# Altium footprint library neoxin.PcbLib: 61 footprints (part 3 of 4)
Each footprint in its own frame and in the unit in brackets; x right, y up, seen from the top. Pads: shape width x height; smd on the part's side, far side on the other; paste and mask are expansions set on the pad; w line width, h text height; cw(c..) or ccw(c..) is an arc to the next point about the centre after c.
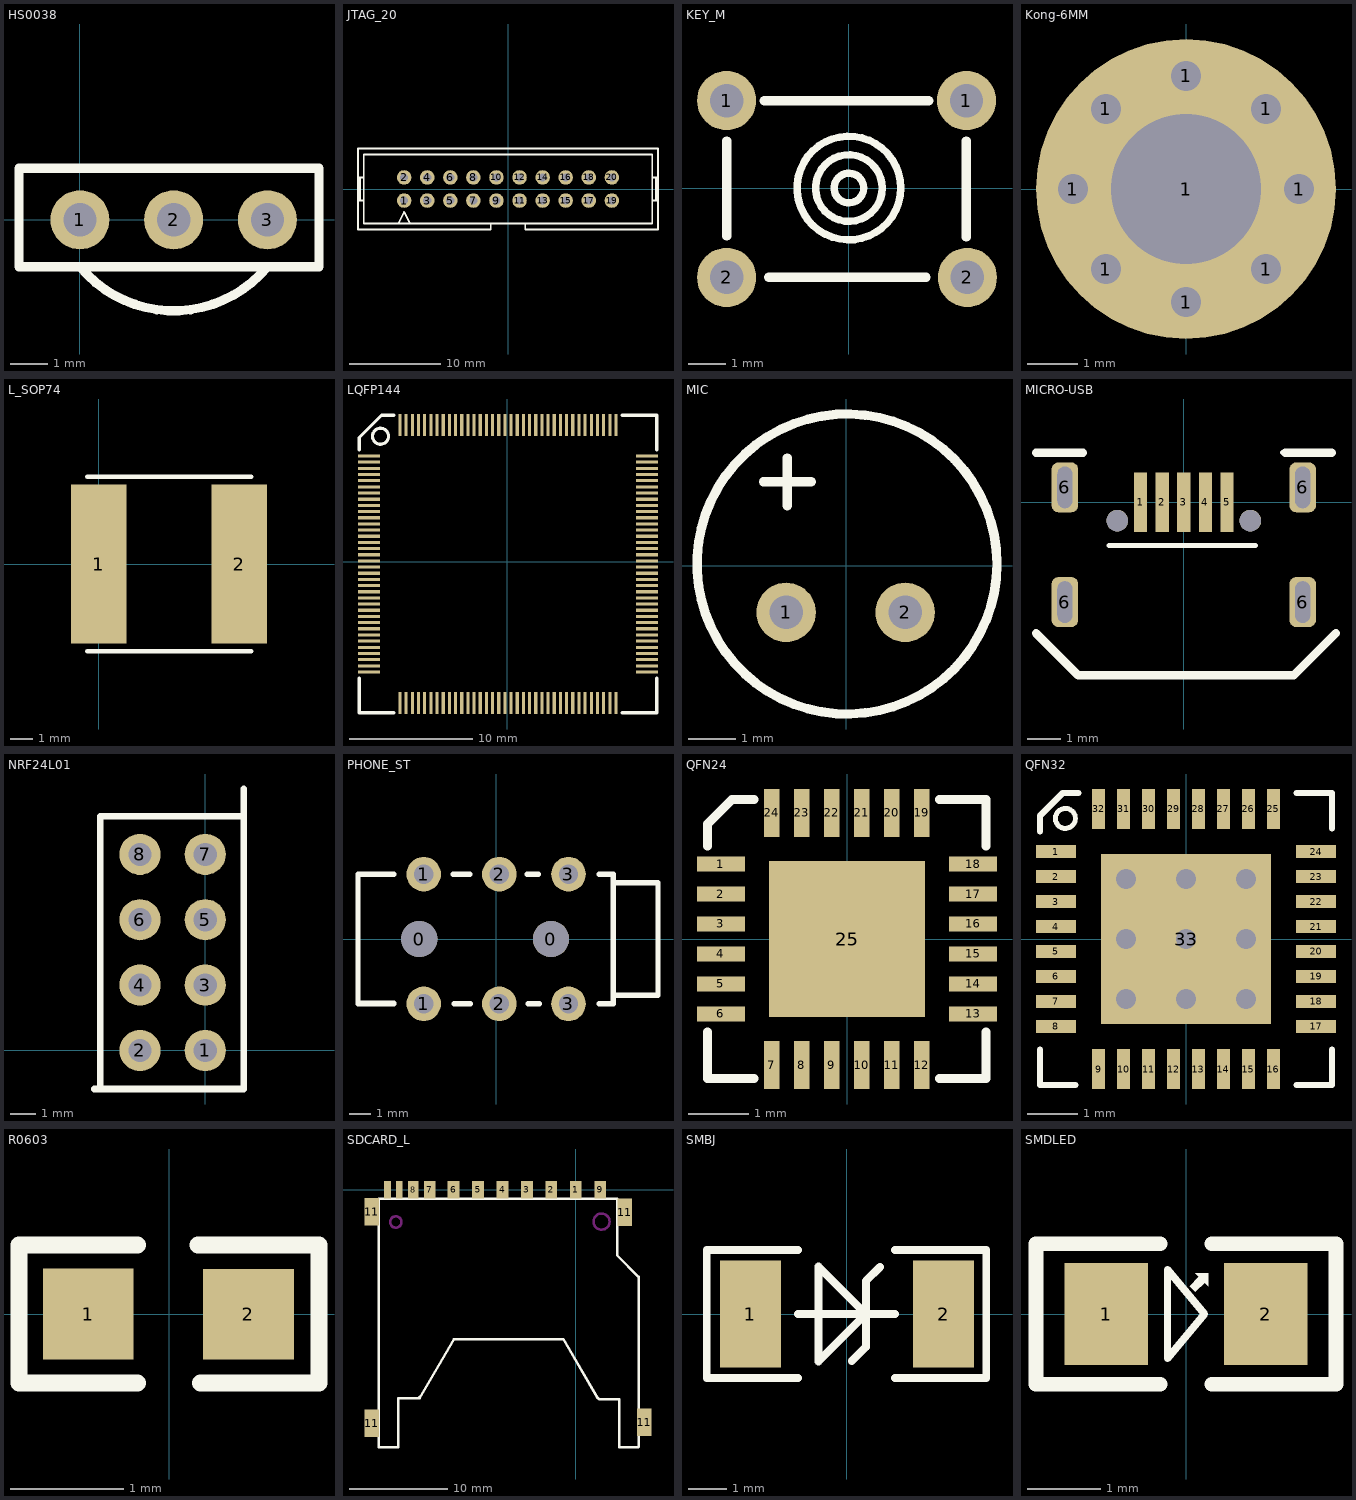
[diagram p2: the footprints below, top view; thin cyan lines are the x and y axes]

## HS0038 [mm]
pads (3):
  round 1.6 hole 0.9: 1(0,0) 2(2.54,0) 3(5.08,0)
Top Overlay:
  lines w0.254: 0,-1.27 ccw(c2.54,0.834) 5.08,-1.27 ; -1.651,-1.27 -1.651,1.397 6.477,1.397 6.477,-1.27 -1.651,-1.27

## JTAG_20 [mm]
pads (20):
  round 1.6 hole 0.9: 1(-11.43,-1.27) 2(-11.43,1.27) 3(-8.89,-1.27) 4(-8.89,1.27) 5(-6.35,-1.27) 6(-6.35,1.27) 7(-3.81,-1.27) 8(-3.81,1.27) 9(-1.27,-1.27) 10(-1.27,1.27) 11(1.27,-1.27) 12(1.27,1.27) 13(3.81,-1.27) 14(3.81,1.27) 15(6.35,-1.27) 16(6.35,1.27) 17(8.89,-1.27) 18(8.89,1.27) 19(11.43,-1.27) 20(11.43,1.27)
Top Overlay:
  lines w0.203: -16.51,-1.27 -15.875,-1.27 ; -16.51,1.27 -15.875,1.27 ; -16.298,-1.27 -16.298,1.27 ; -12.065,-3.81 -11.43,-2.54 -10.795,-3.81 ; -8.625,-4.445 -1.905,-4.445 -1.905,-3.81 ; -8.255,-4.445 -16.51,-4.445 -16.51,4.445 16.51,4.445 16.51,-4.445 8.255,-4.445 1.905,-4.445 1.905,-3.81 ; 15.875,-1.27 16.51,-1.27 ; 15.875,1.27 16.51,1.27 ; 16.298,-1.27 16.298,1.27 ; -1.905,-3.81 -15.875,-3.81 -15.875,3.81 15.875,3.81 15.875,-3.81 1.905,-3.81 ; -1.905,-3.81 1.905,-3.81
3D body "SW3dPS-PinBox Connector_20Pin.STEP": height 10.9, standoff -3, extent -16.439,-4.451 16.561,4.349

## KEY_M [mm]
pads (4):
  round 1.6 hole 0.9: 1(-3.302,2.362) 1(3.175,2.362) 2(-3.302,-2.413) 2(3.2,-2.413)
Top Overlay:
  circle w0.2: c0,0 r1.4
  circle w0.2: c0,0 r0.9
  circle w0.2: c0,0 r0.4
  lines w0.254: -3.302,-1.295 -3.302,1.27 ; -2.286,2.362 2.16,2.362 ; -2.159,-2.413 2.083,-2.413 ; 3.175,-1.321 3.175,1.27
3D body "4pin_TS-1143-WP.STEP": height 4.3, standoff -3.5, extent -4.175,-3.27 4.092,3.23

## Kong-6MM [mm]
pads (9):
  round 0.6 hole 0.6: 1(-2.261,0) 1(-1.6,-1.6) 1(-1.6,1.6) 1(0,-2.261) 1(0,2.261) 1(1.6,-1.6) 1(1.6,1.6) 1(2.261,0)
  round 6 hole 3: 1(0,0)

## L_SOP74 [mm]
pads (2):
  rect 2.5x7.2 smd: 1(0,0) 2(6.35,0)
Top Overlay:
  lines w0.203: -0.508,-3.937 6.892,-3.937 ; -0.508,3.937 6.892,3.937
3D body "SUMIDA-CDRH6D28.STEP": height 2.9, standoff 0, extent -0.16,-3.33 6.54,3.37

## LQFP144 [mm]
pads (144):
  rect 1.8x0.254 smd: 1(-11.185,8.56) 2(-11.185,8.06) 3(-11.185,7.56) 4(-11.185,7.06) 5(-11.185,6.56) 6(-11.185,6.06) 7(-11.185,5.56) 8(-11.185,5.06) 9(-11.185,4.56) 10(-11.185,4.06) 11(-11.185,3.56) 12(-11.185,3.06) 13(-11.185,2.56) 14(-11.185,2.06) 15(-11.185,1.56) 16(-11.185,1.06) 17(-11.185,0.56) 18(-11.185,0.06) 19(-11.185,-0.44) 20(-11.185,-0.94) 21(-11.185,-1.44) 22(-11.185,-1.94) 23(-11.185,-2.44) 24(-11.185,-2.94) 25(-11.185,-3.44) 26(-11.185,-3.94) 27(-11.185,-4.44) 28(-11.185,-4.94) 29(-11.185,-5.44) 30(-11.185,-5.94) 31(-11.185,-6.44) 32(-11.185,-6.94) 33(-11.185,-7.44) 34(-11.185,-7.94) 35(-11.185,-8.44) 36(-11.185,-8.94) 73(11.315,-8.94) 74(11.315,-8.44) 75(11.315,-7.94) 76(11.315,-7.44) 77(11.315,-6.94) 78(11.315,-6.44) 79(11.315,-5.94) 80(11.315,-5.44) 81(11.315,-4.94) 82(11.315,-4.44) 83(11.315,-3.94) 84(11.315,-3.44) 85(11.315,-2.94) 86(11.315,-2.44) 87(11.315,-1.94) 88(11.315,-1.44) 89(11.315,-0.94) 90(11.315,-0.44) 91(11.315,0.06) 92(11.315,0.56) 93(11.315,1.06) 94(11.315,1.56) 95(11.315,2.06) 96(11.315,2.56) 97(11.315,3.06) 98(11.315,3.56) 99(11.315,4.06) 100(11.315,4.56) 101(11.315,5.06) 102(11.315,5.56) 103(11.315,6.06) 104(11.315,6.56) 105(11.315,7.06) 106(11.315,7.56) 107(11.315,8.06) 108(11.315,8.56)
  rect 0.254x1.8 smd: 37(-8.685,-11.44) 38(-8.185,-11.44) 39(-7.685,-11.44) 40(-7.185,-11.44) 41(-6.685,-11.44) 42(-6.185,-11.44) 43(-5.685,-11.44) 44(-5.185,-11.44) 45(-4.685,-11.44) 46(-4.185,-11.44) 47(-3.685,-11.44) 48(-3.185,-11.44) 49(-2.685,-11.44) 50(-2.185,-11.44) 51(-1.685,-11.44) 52(-1.185,-11.44) 53(-0.685,-11.44) 54(-0.185,-11.44) 55(0.315,-11.44) 56(0.815,-11.44) 57(1.315,-11.44) 58(1.815,-11.44) 59(2.315,-11.44) 60(2.815,-11.44) 61(3.315,-11.44) 62(3.815,-11.44) 63(4.315,-11.44) 64(4.815,-11.44) 65(5.315,-11.44) 66(5.815,-11.44) 67(6.315,-11.44) 68(6.815,-11.44) 69(7.315,-11.44) 70(7.815,-11.44) 71(8.315,-11.44) 72(8.815,-11.44) 109(8.815,11.06) 110(8.315,11.06) 111(7.815,11.06) 112(7.315,11.06) 113(6.815,11.06) 114(6.315,11.06) 115(5.815,11.06) 116(5.315,11.06) 117(4.815,11.06) 118(4.315,11.06) 119(3.815,11.06) 120(3.315,11.06) 121(2.815,11.06) 122(2.315,11.06) 123(1.815,11.06) 124(1.315,11.06) 125(0.815,11.06) 126(0.315,11.06) 127(-0.185,11.06) 128(-0.685,11.06) 129(-1.185,11.06) 130(-1.685,11.06) 131(-2.185,11.06) 132(-2.685,11.06) 133(-3.185,11.06) 134(-3.685,11.06) 135(-4.185,11.06) 136(-4.685,11.06) 137(-5.185,11.06) 138(-5.685,11.06) 139(-6.185,11.06) 140(-6.685,11.06) 141(-7.185,11.06) 142(-7.685,11.06) 143(-8.185,11.06) 144(-8.685,11.06)
Top Overlay:
  circle w0.254: c-10.262,10.16 r0.65
  lines w0.254: -11.985,-9.423 -11.985,-12.24 -9.169,-12.24 ; -11.985,9.042 -11.985,10.062 -10.187,11.86 -9.169,11.86 ; 9.296,-12.24 12.115,-12.24 12.115,-9.423 ; 9.296,11.86 12.115,11.86 12.115,9.042
3D body "LQFP144.STEP": height 1.71, standoff 0.14, extent -10.82,-11.074 10.952,10.698

## MIC [mm]
pads (2):
  round 1.27 hole 0.711: 1(-1.285,-1) 2(1.255,-1)
Top Overlay:
  circle w0.2: c0.015,0.033 r3.2
  lines w0.2: -1.767,1.785 -0.751,1.785 ; -1.259,1.277 -1.259,2.293

## MICRO-USB [mm]
pads (11):
  rect 0.4x1.8 smd: 1(-1.3,0) 2(-0.65,0) 3(0,0) 4(0.65,0) 5(1.3,0)
  rrect50% 0.8x1.5 hole 0.45 slot 1.25 at 90 deg: 6(-3.575,-3) 6(-3.575,0.45) 6(3.575,-3) 6(3.575,0.45)
  round 0.65 hole 0.65 unplated: ""(-2,-0.55) ""(2,-0.55)
Top Overlay:
  lines w0.1: -2.921,-5.207 3.302,-5.207
  lines w0.152: -4.445,1.493 -3.031,1.493 ; -2.25,-1.3 2.15,-1.3 ; 2.968,1.497 4.45,1.497
  lines w0.254: -4.445,-3.937 -3.175,-5.207 3.302,-5.207 4.577,-3.932 ; -4.445,1.493 -3.031,1.493 ; 3.048,1.497 4.318,1.497 ; 4.05,1.497 4.45,1.497
  text "." at -2.032,1.397 h1
3D body "User Library-MicroUSB-B_Molex_105017-0001.STEP": height 2.68, standoff -0.63, extent -4.1,-4.685 4.1,0.745

## NRF24L01 [mm]
pads (8):
  round 1.6 hole 0.9: 1(0,0) 2(-2.54,0) 3(0,2.54) 4(-2.54,2.54) 5(0,5.08) 6(-2.54,5.08) 7(0,7.62) 8(-2.54,7.62)
Top Overlay:
  lines w0.254: -4.318,-1.5 -4.089,-1.5 ; 1.5,9.093 -4.089,9.093 -4.089,-1.5 ; 1.5,10.16 1.5,-1.5 -4.089,-1.5
3D body "User Library-BL1-004-S842-55.step": height 8.42, standoff -3.2, extent -1.27,-1.52 1.27,9.14
3D body "User Library-BL1-004-S842-55.step": height 8.42, standoff -3.2, extent -3.81,-1.52 -1.27,9.14

## PHONE_ST [mm]
pads (8):
  round 1.676 hole 1.676: 0(-3.556,0) 0(2.54,0)
  round 1.6 hole 0.9: 1(-3.35,-3) 1(-3.35,3) 2(0.15,-3) 2(0.15,3) 3(3.35,-3) 3(3.35,3)
Top Overlay:
  lines w0.254: -6.393,-2.969 -4.742,-2.969 ; -4.742,-3.007 -6.393,-3.007 -6.393,3 -4.742,3 ; -1.986,3 -1.224,3 ; -1.948,-3.007 -1.186,-3.007 ; 1.443,3 1.951,3 ; 1.481,-3.007 1.989,-3.007 ; 4.783,-3.007 5.33,-3.007 ; 4.783,3 5.418,3 5.418,-3.007 ; 5.418,-2.6 7.493,-2.6 7.493,2.6 5.418,2.6
3D body "mj-2523-smt.stp": height 4.7, standoff -0.6, extent -6.375,-4 7.125,4

## QFN24 [mm]
pads (25):
  rect 0.8x0.254 smd: 1(-2.101,1.25) 2(-2.101,0.75) 3(-2.101,0.25) 4(-2.101,-0.25) 5(-2.101,-0.75) 6(-2.101,-1.25) 13(2.101,-1.25) 14(2.101,-0.75) 15(2.101,-0.25) 16(2.101,0.25) 17(2.101,0.75) 18(2.101,1.25)
  rect 0.254x0.8 smd: 7(-1.255,-2.101) 8(-0.755,-2.101) 9(-0.255,-2.101) 10(0.245,-2.101) 11(0.745,-2.101) 12(1.245,-2.101) 19(1.245,2.101) 20(0.745,2.101) 21(0.245,2.101) 22(-0.255,2.101) 23(-0.755,2.101) 24(-1.255,2.101)
  rect 2.6x2.6 smd: 25(0,0)
Top Overlay:
  lines w0.15: -2.33,-1.55 -2.33,-2.325 -1.555,-2.325 ; -2.33,1.55 -2.33,1.917 -1.921,2.325 -1.555,2.325 ; 1.545,-2.325 2.32,-2.325 2.32,-1.55 ; 1.545,2.325 2.32,2.325 2.32,1.55
3D body "QFN24.step": height 0.9, standoff 0, extent -2.002,-2.002 2.002,2.002

## QFN32 [mm]
pads (33):
  rect 0.8x0.254 smd: 1(-2.601,1.75) 2(-2.601,1.25) 3(-2.601,0.75) 4(-2.601,0.25) 5(-2.601,-0.25) 6(-2.601,-0.75) 7(-2.601,-1.25) 8(-2.601,-1.75) 17(2.601,-1.75) 18(2.601,-1.25) 19(2.601,-0.75) 20(2.601,-0.25) 21(2.601,0.25) 22(2.601,0.75) 23(2.601,1.25) 24(2.601,1.75)
  rect 0.254x0.8 smd: 9(-1.75,-2.601) 10(-1.25,-2.601) 11(-0.75,-2.601) 12(-0.25,-2.601) 13(0.25,-2.601) 14(0.75,-2.601) 15(1.25,-2.601) 16(1.75,-2.601) 25(1.75,2.601) 26(1.25,2.601) 27(0.75,2.601) 28(0.25,2.601) 29(-0.25,2.601) 30(-0.75,2.601) 31(-1.25,2.601) 32(-1.75,2.601)
  rect 3.4x3.4 smd: 33(0,0)
via -1.2,1.2 diameter 0.7 hole 0.4
via 0,1.2 diameter 0.7 hole 0.4
via 1.2,1.2 diameter 0.7 hole 0.4
via -1.2,0 diameter 0.7 hole 0.4
via 0,0 diameter 0.7 hole 0.4
via 1.2,0 diameter 0.7 hole 0.4
via -1.2,-1.2 diameter 0.7 hole 0.4
via 0,-1.2 diameter 0.7 hole 0.4
via 1.2,-1.2 diameter 0.7 hole 0.4
Top Overlay:
  circle w0.1: c-2.413,2.413 r0.2
  lines w0.127: -2.921,-2.21 -2.921,-2.921 -2.21,-2.921 ; -2.921,2.159 -2.921,2.464 -2.464,2.921 -2.159,2.921 ; 2.21,-2.921 2.921,-2.921 2.921,-2.21 ; 2.21,2.921 2.921,2.921 2.921,2.21
Mechanical 15:
  lines w0.1: -0.5,0 0.5,0 ; 0,-0.5 0,0.5
3D body "qfn32-5x5.step": height 0.8, standoff 0, extent -2.52,-2.51 2.5,2.51

## R0603 [mm]
pads (2):
  rect 0.8x0.8 smd: 1(-0.711,0) 2(0.699,-0.002)
Top Overlay:
  lines w0.15: -0.279,-0.61 -1.321,-0.61 -1.321,0.61 -0.279,0.61 ; 0.254,0.61 1.295,0.61 ; 0.279,-0.61 1.321,-0.61 1.321,0.61
3D body "User Library-RES_1609-0603.STEP": height 0.56, standoff 0, extent -0.85,-0.4 0.85,0.4

## SDCARD_L [mm]
pads (15):
  rect 1.2x1.8 smd: 1(0,0) 2(-2.489,0) 3(-4.983,-0.009) 4(-7.483,-0.009) 5(-9.983,-0.009) 6(-12.483,-0.009) 7(-14.908,-0.009) 9(2.517,-0.009)
  rect 1.1x1.8 smd: 8(-16.612,0)
  rect 0.7x1.8 smd: 10(-18.034,0) 12(-19.253,0)
  rect 1.5x2.8 smd: 11(-20.853,-23.851) 11(-20.853,-2.261) 11(5.004,-2.286) 11(7.01,-23.784)
Top Overlay:
  lines w0.254: -18.158,-21.3 -18.158,-26.3 -20.131,-26.3 -20.131,-0.914 -20.117,-0.9 4.242,-0.9 4.242,-6.71 6.431,-8.899 6.442,-8.899 6.442,-26.273 6.415,-26.3 4.442,-26.3 4.442,-21.402 2.4,-21.402 2.242,-21.244 ; -18.107,-21.294 -16.065,-21.294 -15.907,-21.136 ; -15.958,-21.294 -12.446,-15.3 ; -12.458,-15.3 -1.258,-15.3 2.242,-21.294
Keep-Out Layer:
  circle w0.254: c-18.39,-3.3 r0.58
  circle w0.254: c2.642,-3.26 r0.82
3D body "TF.step": height 1.9, standoff -2, extent -20.934,-26.34 7.041,-0.09

## SMBJ [mm]
pads (2):
  rect 1.6x2.8 smd: 1(-2.515,0) 2(2.54,0)
Top Overlay:
  lines w0.203: -1.27,-1.676 -3.658,-1.676 -3.658,1.676 -1.27,1.676 ; -1.27,0 1.27,0 ; -0.737,1.245 -0.737,-1.245 0.508,0 -0.724,1.232 ; 0.14,-1.232 0.508,-0.864 0.508,0.864 0.876,1.232 ; 1.27,-1.676 3.658,-1.676 3.658,1.676 1.27,1.676
3D body "User Library-S1G.STEP": height 2.12, standoff -0.02, extent -2.527,-1.333 2.578,1.334

## SMDLED [mil]
pads (2):
  rect 45x55 smd: 1(-43,0) 2(43,0)
Top Overlay:
  region: 2,15 7,20 5,22 12,22 12,15 10,17 5,12
  lines w3.94: -10,-24 10,0 -10,24 -10,-24
  lines w7.87: -14,-38 -81,-38 -81,38 -14,38 ; 14,-38 81,-38 81,38 14,38
3D body "led0805  green.step": height 43.31, standoff -0.5, extent -40,-25 40,25